# Altium footprint library circuits integres.PcbLib: 97 footprints (part 1 of 7)
Each footprint in its own frame and in the unit in brackets; x right, y up, seen from the top. Pads: shape width x height; smd on the part's side, far side on the other; paste and mask are expansions set on the pad; w line width, h text height; cw(c..) or ccw(c..) is an arc to the next point about the centre after c.
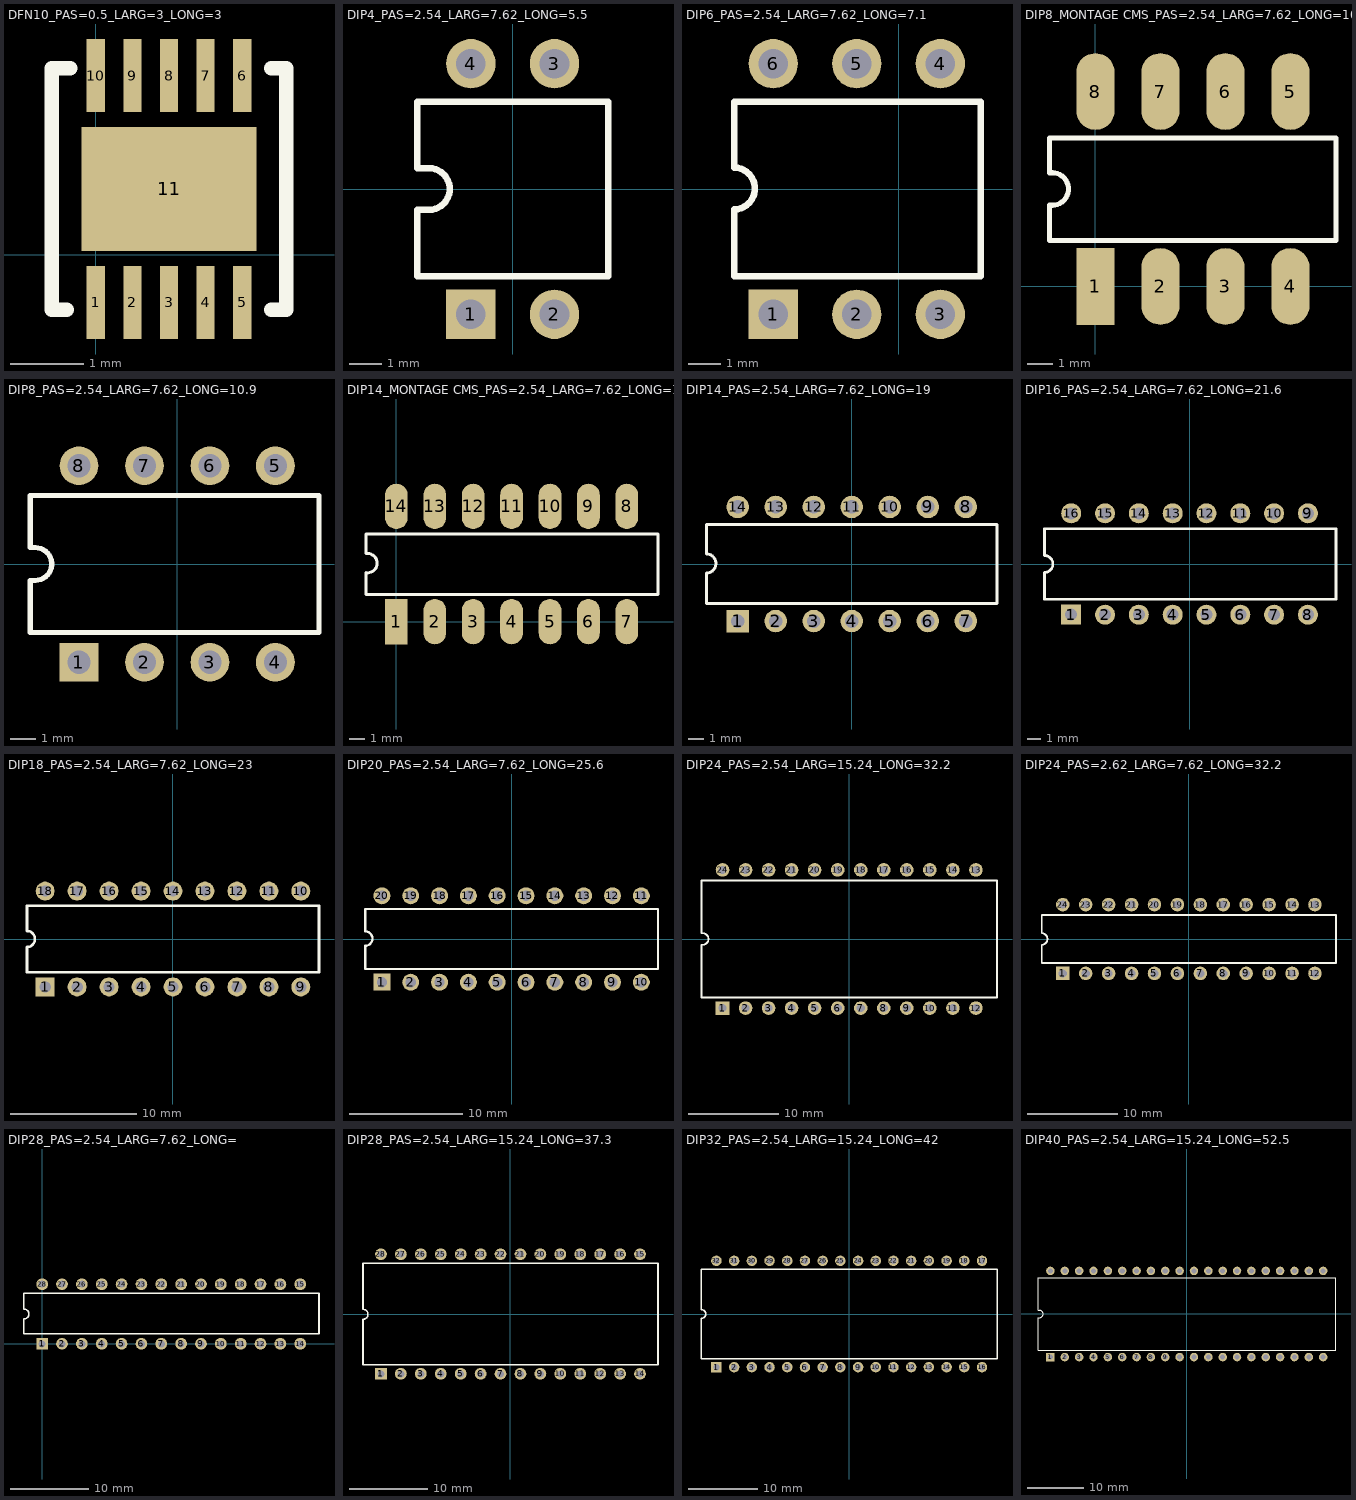
[diagram p0: the footprints below, top view; thin cyan lines are the x and y axes]

## DFN10_PAS=0.5_LARG=3_LONG=3 [mm] "Dual Flat No-Lead Plastic Package (DFN) ; 10 lead ; DIMENSIONS : 3mm x 3mm ; Pin Spacing = 0.5mm"
height 0.75
pads (11):
  rect 0.25x1 smd: 1(0,-0.65) 2(0.5,-0.65) 3(1,-0.65) 4(1.5,-0.65) 5(2,-0.65) 6(2,2.45) 7(1.5,2.45) 8(1,2.45) 9(0.5,2.45) 10(0,2.45)
  rect 2.39x1.7 smd: 11(1,0.9)
Top Overlay:
  lines w0.2: -0.4,-0.75 -0.6,-0.75 -0.6,2.55 -0.35,2.55 ; 2.4,-0.75 2.6,-0.75 2.6,2.55 2.4,2.55
3D body: height 0.75, standoff -0.05, extent -0.5,-0.85 2.5,2.65

## DIP4_PAS=2.54_LARG=7.62_LONG=5.5 [mm] "Dual-In-Line Plastic Packages (PDIP) ; 4 Leads ; Row Spacing = 7.62 mm ; Pitch = 2.54 mm"
height 5
pads (4):
  rect 1.5x1.5 hole 0.9: 1(-1.27,-3.81)
  round 1.5 hole 0.9: 2(1.27,-3.81) 3(1.27,3.81) 4(-1.27,3.81)
Top Overlay:
  lines w0.2: -2.9,-2.65 2.9,-2.65 2.9,2.65 -2.9,2.65 -2.9,0.635 -2.55,0.635 cw(c-2.55,0) -2.55,-0.635 -2.9,-0.635 -2.9,-2.65
3D body: height 4.31, standoff -3.28, extent -2.77,-4 2.77,4

## DIP6_PAS=2.54_LARG=7.62_LONG=7.1 [mm] "Dual-In-Line Plastic Packages (PDIP) ; 6 Leads ; Row Spacing = 7.62 mm ; Pitch = 2.54 mm"
height 5
pads (6):
  rect 1.5x1.5 hole 0.9: 1(-3.81,-3.81)
  round 1.5 hole 0.9: 2(-1.27,-3.81) 3(1.27,-3.81) 4(1.27,3.81) 5(-1.27,3.81) 6(-3.81,3.81)
Top Overlay:
  lines w0.2: -5,-0.65 -5,-2.65 2.5,-2.65 2.5,2.65 -5,2.65 -5,0.65 cw(c-5,0.015) -5,-0.62
3D body: height 4.3, standoff -3, extent -4.85,-3.985 2.27,3.885

## DIP8_MONTAGE CMS_PAS=2.54_LARG=7.62_LONG=10.9 [mm] "Dual-In-Line Plastic Packages (PDIP) ; 8 Leads ; Row Spacing = 7.62mm ; Pitch = 2.54 mm"
height 7.2
pads (8):
  rect 1.5x3 smd: 1(0,0)
  oval 1.5x3 smd: 2(2.54,0) 3(5.08,0) 4(7.62,0) 5(7.62,7.62) 6(5.08,7.62) 7(2.54,7.62) 8(0,7.62)
Top Overlay:
  lines w0.2: -1.8,1.8 -1.8,3.175 -1.69,3.175 ccw(c-1.69,3.81) -1.69,4.445 -1.8,4.445 -1.8,5.8 9.4,5.8 9.4,1.8 -1.8,1.8
3D body: height 8.58, standoff 0, extent -1.7,-0.285 9.22,7.585

## DIP8_PAS=2.54_LARG=7.62_LONG=10.9 [mm] "Dual-In-Line Plastic Packages (PDIP) ; 8 Leads ; Row Spacing = 7.62 mm ; Pitch = 2.54 mm"
height 5
pads (8):
  rect 1.5x1.5 hole 0.9: 1(-3.81,-3.81)
  round 1.5 hole 0.9: 2(-1.27,-3.81) 3(1.27,-3.81) 4(3.81,-3.81) 5(3.81,3.81) 6(1.27,3.81) 7(-1.27,3.81) 8(-3.81,3.81)
Top Overlay:
  lines w0.2: -5.7,-2.65 5.5,-2.65 5.5,2.65 -5.7,2.65 -5.7,0.635 -5.5,0.635 cw(c-5.5,0) -5.5,-0.635 -5.7,-0.635 -5.7,-2.65
3D body: height 5.08, standoff -3.5, extent -5.56,-3.92 5.36,3.95

## DIP14_MONTAGE CMS_PAS=2.54_LARG=7.62_LONG=19 [mm] "Dual-In-Line Plastic Packages (PDIP) ; 14 Leads ; Row Spacing = 7.62mm ; Pitch = 2.54 mm"
height 7.2
pads (14):
  rect 1.5x3 smd: 1(0,0)
  oval 1.5x3 smd: 2(2.54,0) 3(5.08,0) 4(7.62,0) 5(10.16,0) 6(12.7,0) 7(15.24,0) 8(15.24,7.62) 9(12.7,7.62) 10(10.16,7.62) 11(7.62,7.62) 12(5.08,7.62) 13(2.54,7.62) 14(0,7.62)
Top Overlay:
  lines w0.2: -2,3.237 -2,1.8 17.3,1.8 17.3,5.8 -2,5.8 -2,4.5 ; -1.999,4.492 cw(c-1.9,3.865) -1.994,3.237
3D body: height 6.89, standoff 0.03, extent -1.9,-0.087 17.15,7.787

## DIP14_PAS=2.54_LARG=7.62_LONG=19 [mm] "Dual-In-Line Plastic Packages (PDIP) ; 14 Leads ; Row Spacing = 7.62 mm ; Pitch = 2.54 mm"
height 5
pads (14):
  rect 1.5x1.5 hole 0.9: 1(-7.62,-3.81)
  round 1.5 hole 0.9: 2(-5.08,-3.81) 3(-2.54,-3.81) 4(0,-3.81) 5(2.54,-3.81) 6(5.08,-3.81) 7(7.62,-3.81) 8(7.62,3.81) 9(5.08,3.81) 10(2.54,3.81) 11(0,3.81) 12(-2.54,3.81) 13(-5.08,3.81) 14(-7.62,3.81)
Top Overlay:
  lines w0.2: -9.7,-2.65 9.7,-2.65 9.7,2.65 -9.7,2.65 -9.7,0.67 cw(c-9.7,0.035) -9.7,-0.6 -9.7,-1.035 -9.7,-2.65
3D body: height 4.19, standoff -2.67, extent -9.525,-3.95 9.525,3.924

## DIP16_PAS=2.54_LARG=7.62_LONG=21.6 [mm] "Dual-In-Line Plastic Packages (PDIP) ; 16 Leads ; Row Spacing = 7.62 mm ; Pitch = 2.54 mm"
height 5
pads (16):
  rect 1.5x1.5 hole 0.9: 1(-8.89,-3.81)
  round 1.5 hole 0.9: 2(-6.35,-3.81) 3(-3.81,-3.81) 4(-1.27,-3.81) 5(1.27,-3.81) 6(3.81,-3.81) 7(6.35,-3.81) 8(8.89,-3.81) 9(8.89,3.81) 10(6.35,3.81) 11(3.81,3.81) 12(1.27,3.81) 13(-1.27,3.81) 14(-3.81,3.81) 15(-6.35,3.81) 16(-8.89,3.81)
Top Overlay:
  lines w0.2: -10.8,0.635 -10.9,0.635 ; -10.9,0.635 cw(c-10.9,0) -10.9,-0.635 -10.9,-2.65 11,-2.65 11,2.65 -10.9,2.65 -10.9,0.635
3D body: height 4.19, standoff -2.57, extent -10.745,-3.924 10.845,3.95

## DIP18_PAS=2.54_LARG=7.62_LONG=23 [mm] "Dual-In-Line Plastic Packages (PDIP) ; 18 Leads ; Row Spacing = 7.62 mm ; Pitch = 2.54 mm"
height 5
pads (18):
  rect 1.5x1.5 hole 0.9: 1(-10.16,-3.81)
  round 1.5 hole 0.9: 2(-7.62,-3.81) 3(-5.08,-3.81) 4(-2.54,-3.81) 5(0,-3.81) 6(2.54,-3.81) 7(5.08,-3.81) 8(7.62,-3.81) 9(10.16,-3.81) 10(10.16,3.81) 11(7.62,3.81) 12(5.08,3.81) 13(2.54,3.81) 14(0,3.81) 15(-2.54,3.81) 16(-5.08,3.81) 17(-7.62,3.81) 18(-10.16,3.81)
Top Overlay:
  lines w0.2: -11.6,-2.65 -11.6,-0.635 ccw(c-11.6,0) -11.6,0.635 -11.6,2.65 11.6,2.65 11.6,-2.65 -11.6,-2.65
3D body: height 5.08, standoff -2.49, extent -11.5,-3.95 11.49,3.92

## DIP20_PAS=2.54_LARG=7.62_LONG=25.6 [mm] "Dual-In-Line Plastic Packages (PDIP) ; 20 Leads ; Row Spacing = 7.62 mm ; Pitch = 2.54 mm"
height 5
pads (20):
  rect 1.5x1.5 hole 0.9: 1(-11.43,-3.81)
  round 1.5 hole 0.9: 2(-8.89,-3.81) 3(-6.35,-3.81) 4(-3.81,-3.81) 5(-1.27,-3.81) 6(1.27,-3.81) 7(3.81,-3.81) 8(6.35,-3.81) 9(8.89,-3.81) 10(11.43,-3.81) 11(11.43,3.81) 12(8.89,3.81) 13(6.35,3.81) 14(3.81,3.81) 15(1.27,3.81) 16(-1.27,3.81) 17(-3.81,3.81) 18(-6.35,3.81) 19(-8.89,3.81) 20(-11.43,3.81)
Top Overlay:
  lines w0.2: -12.9,-2.65 -12.9,-0.6 ccw(c-12.9,0.035) -12.9,0.67 -12.9,2.65 12.9,2.65 12.9,-2.65 -12.9,-2.65
3D body: height 4.5, standoff -3.5, extent -12.8,-3.961 12.8,3.8

## DIP24_PAS=2.54_LARG=15.24_LONG=32.2 [mm] "Dual-In-Line Plastic Packages (PDIP) ; 24 Leads ; Row Spacing = 15.24 mm ; Pitch = 2.54 mm"
height 5
pads (24):
  rect 1.5x1.5 hole 0.9: 1(-13.97,-7.62)
  round 1.5 hole 0.9: 2(-11.43,-7.62) 3(-8.89,-7.62) 4(-6.35,-7.62) 5(-3.81,-7.62) 6(-1.27,-7.62) 7(1.27,-7.62) 8(3.81,-7.62) 9(6.35,-7.62) 10(8.89,-7.62) 11(11.43,-7.62) 12(13.97,-7.62) 13(13.97,7.62) 14(11.43,7.62) 15(8.89,7.62) 16(6.35,7.62) 17(3.81,7.62) 18(1.27,7.62) 19(-1.27,7.62) 20(-3.81,7.62) 21(-6.35,7.62) 22(-8.89,7.62) 23(-11.43,7.62) 24(-13.97,7.62)
Top Overlay:
  lines w0.2: -16.3,-6.45 -16.3,-0.635 -16.15,-0.635 ccw(c-16.15,0) -16.15,0.635 -16.3,0.635 -16.3,6.45 16.3,6.45 16.3,-6.45 -16.3,-6.45
3D body: height 5.7, standoff -2.58, extent -16.13,-7.74 16.13,7.75

## DIP24_PAS=2.62_LARG=7.62_LONG=32.2 [mm] "Dual-In-Line Plastic Packages (PDIP) ; 24 Leads ; Row Spacing = 7.62 mm ; Pitch = 2.54 mm"
height 5
pads (24):
  rect 1.5x1.5 hole 0.9: 1(-13.97,-3.81)
  round 1.5 hole 0.9: 2(-11.43,-3.81) 3(-8.89,-3.81) 4(-6.35,-3.81) 5(-3.81,-3.81) 6(-1.27,-3.81) 7(1.27,-3.81) 8(3.81,-3.81) 9(6.35,-3.81) 10(8.89,-3.81) 11(11.43,-3.81) 12(13.97,-3.81) 13(13.97,3.81) 14(11.43,3.81) 15(8.89,3.81) 16(6.35,3.81) 17(3.81,3.81) 18(1.27,3.81) 19(-1.27,3.81) 20(-3.81,3.81) 21(-6.35,3.81) 22(-8.89,3.81) 23(-11.43,3.81) 24(-13.97,3.81)
Top Overlay:
  lines w0.2: -16.3,-2.65 -16.3,-0.635 ccw(c-16.3,0) -16.3,0.635 -16.3,2.65 16.3,2.65 16.3,-2.65 -16.3,-2.65
3D body: height 5.08, standoff -2.49, extent -16.15,-4 16.11,3.87

## DIP28_PAS=2.54_LARG=7.62_LONG= [mm] "Dual-In-Line Plastic Packages (PDIP) ; 24 Leads ; Row Spacing = 7.62 mm ; Pitch = 2.54 mm"
height 5
pads (28):
  rect 1.5x1.5 hole 0.9: 1(0,0)
  round 1.5 hole 0.9: 2(2.54,0) 3(5.08,0) 4(7.62,0) 5(10.16,0) 6(12.7,0) 7(15.24,0) 8(17.78,0) 9(20.32,0) 10(22.86,0) 11(25.4,0) 12(27.94,0) 13(30.48,0) 14(33.02,0) 15(33.02,7.62) 16(30.48,7.62) 17(27.94,7.62) 18(25.4,7.62) 19(22.86,7.62) 20(20.32,7.62) 21(17.78,7.62) 22(15.24,7.62) 23(12.7,7.62) 24(10.16,7.62) 25(7.62,7.62) 26(5.08,7.62) 27(2.54,7.62) 28(0,7.62)
Top Overlay:
  lines w0.2: -2.33,1.27 -2.33,3.175 ccw(c-2.33,3.81) -2.33,4.445 -2.33,6.46 35.42,6.46 35.42,1.27 -2.33,1.27

## DIP28_PAS=2.54_LARG=15.24_LONG=37.3 [mm] "Dual-In-Line Plastic Packages (PDIP) ; 28 Leads ; Row Spacing = 15.24 mm ; Pitch = 2.54 mm"
height 5
pads (28):
  rect 1.5x1.5 hole 0.9: 1(-16.51,-7.62)
  round 1.5 hole 0.9: 2(-13.97,-7.62) 3(-11.43,-7.62) 4(-8.89,-7.62) 5(-6.35,-7.62) 6(-3.81,-7.62) 7(-1.27,-7.62) 8(1.27,-7.62) 9(3.81,-7.62) 10(6.35,-7.62) 11(8.89,-7.62) 12(11.43,-7.62) 13(13.97,-7.62) 14(16.51,-7.62) 15(16.51,7.62) 16(13.97,7.62) 17(11.43,7.62) 18(8.89,7.62) 19(6.35,7.62) 20(3.81,7.62) 21(1.27,7.62) 22(-1.27,7.62) 23(-3.81,7.62) 24(-6.35,7.62) 25(-8.89,7.62) 26(-11.43,7.62) 27(-13.97,7.62) 28(-16.51,7.62)
Top Overlay:
  lines w0.2: -18.8,-6.45 -18.8,-0.885 -18.8,-0.67 ccw(c-18.8,-0.035) -18.8,0.6 -18.8,6.45 18.8,6.45 18.8,-6.45 -18.8,-6.45
3D body: height 5.7, standoff -2.58, extent -18.65,-7.79 18.65,7.7

## DIP32_PAS=2.54_LARG=15.24_LONG=42 [mm] "Dual-In-Line Plastic Packages (PDIP) ; 32 Leads ; Row Spacing = 15.24 mm ; Pitch = 2.54 mm"
height 5
pads (32):
  rect 1.5x1.5 hole 0.9: 1(-19.05,-7.62)
  round 1.5 hole 0.9: 2(-16.51,-7.62) 3(-13.97,-7.62) 4(-11.43,-7.62) 5(-8.89,-7.62) 6(-6.35,-7.62) 7(-3.81,-7.62) 8(-1.27,-7.62) 9(1.27,-7.62) 10(3.81,-7.62) 11(6.35,-7.62) 12(8.89,-7.62) 13(11.43,-7.62) 14(13.97,-7.62) 15(16.51,-7.62) 16(19.05,-7.62) 17(19.05,7.62) 18(16.51,7.62) 19(13.97,7.62) 20(11.43,7.62) 21(8.89,7.62) 22(6.35,7.62) 23(3.81,7.62) 24(1.27,7.62) 25(-1.27,7.62) 26(-3.81,7.62) 27(-6.35,7.62) 28(-8.89,7.62) 29(-11.43,7.62) 30(-13.97,7.62) 31(-16.51,7.62) 32(-19.05,7.62)
Top Overlay:
  lines w0.2: -21.2,-6.45 21.2,-6.45 21.2,6.45 -21.2,6.45 -21.2,0.635 cw(c-21.2,0) -21.2,-0.635 -21.2,-6.45
3D body: height 5.79, standoff -3.3, extent -21.12,-7.686 20.92,7.6

## DIP40_PAS=2.54_LARG=15.24_LONG=52.5 [mm] "Dual-In-Line Plastic Packages (PDIP) ; 40 Leads ; Row Spacing = 15.24 mm ; Pitch = 2.54 mm"
height 5
pads (40):
  rect 1.5x1.5 hole 0.9: 1(-24.13,-7.62)
  round 1.5 hole 0.9: 2(-21.59,-7.62) 3(-19.05,-7.62) 4(-16.51,-7.62) 5(-13.97,-7.62) 6(-11.43,-7.62) 7(-8.89,-7.62) 8(-6.35,-7.62) 9(-3.81,-7.62) 10(-1.27,-7.62) 11(1.27,-7.62) 12(3.81,-7.62) 13(6.35,-7.62) 14(8.89,-7.62) 15(11.43,-7.62) 16(13.97,-7.62) 17(16.51,-7.62) 18(19.05,-7.62) 19(21.59,-7.62) 20(24.13,-7.62) 21(24.13,7.62) 22(21.59,7.62) 23(19.05,7.62) 24(16.51,7.62) 25(13.97,7.62) 26(11.43,7.62) 27(8.89,7.62) 28(6.35,7.62) 29(3.81,7.62) 30(1.27,7.62) 31(-1.27,7.62) 32(-3.81,7.62) 33(-6.35,7.62) 34(-8.89,7.62) 35(-11.43,7.62) 36(-13.97,7.62) 37(-16.51,7.62) 38(-19.05,7.62) 39(-21.59,7.62) 40(-24.13,7.62)
Top Overlay:
  lines w0.2: -26.3,-6.45 26.4,-6.45 26.4,6.45 -26.3,6.45 -26.3,0.635 -26.05,0.635 cw(c-26.05,0) -26.05,-0.635 -26.3,-0.635 -26.3,-6.45
3D body: height 5.7, standoff -2.58, extent -26.2,-7.8 26.25,7.69